# Altium footprint library IC_updated.PcbLib: 64 footprints (part 3 of 4)
Each footprint in its own frame and in the unit in brackets; x right, y up, seen from the top. Pads: shape width x height; smd on the part's side, far side on the other; paste and mask are expansions set on the pad; w line width, h text height; cw(c..) or ccw(c..) is an arc to the next point about the centre after c.
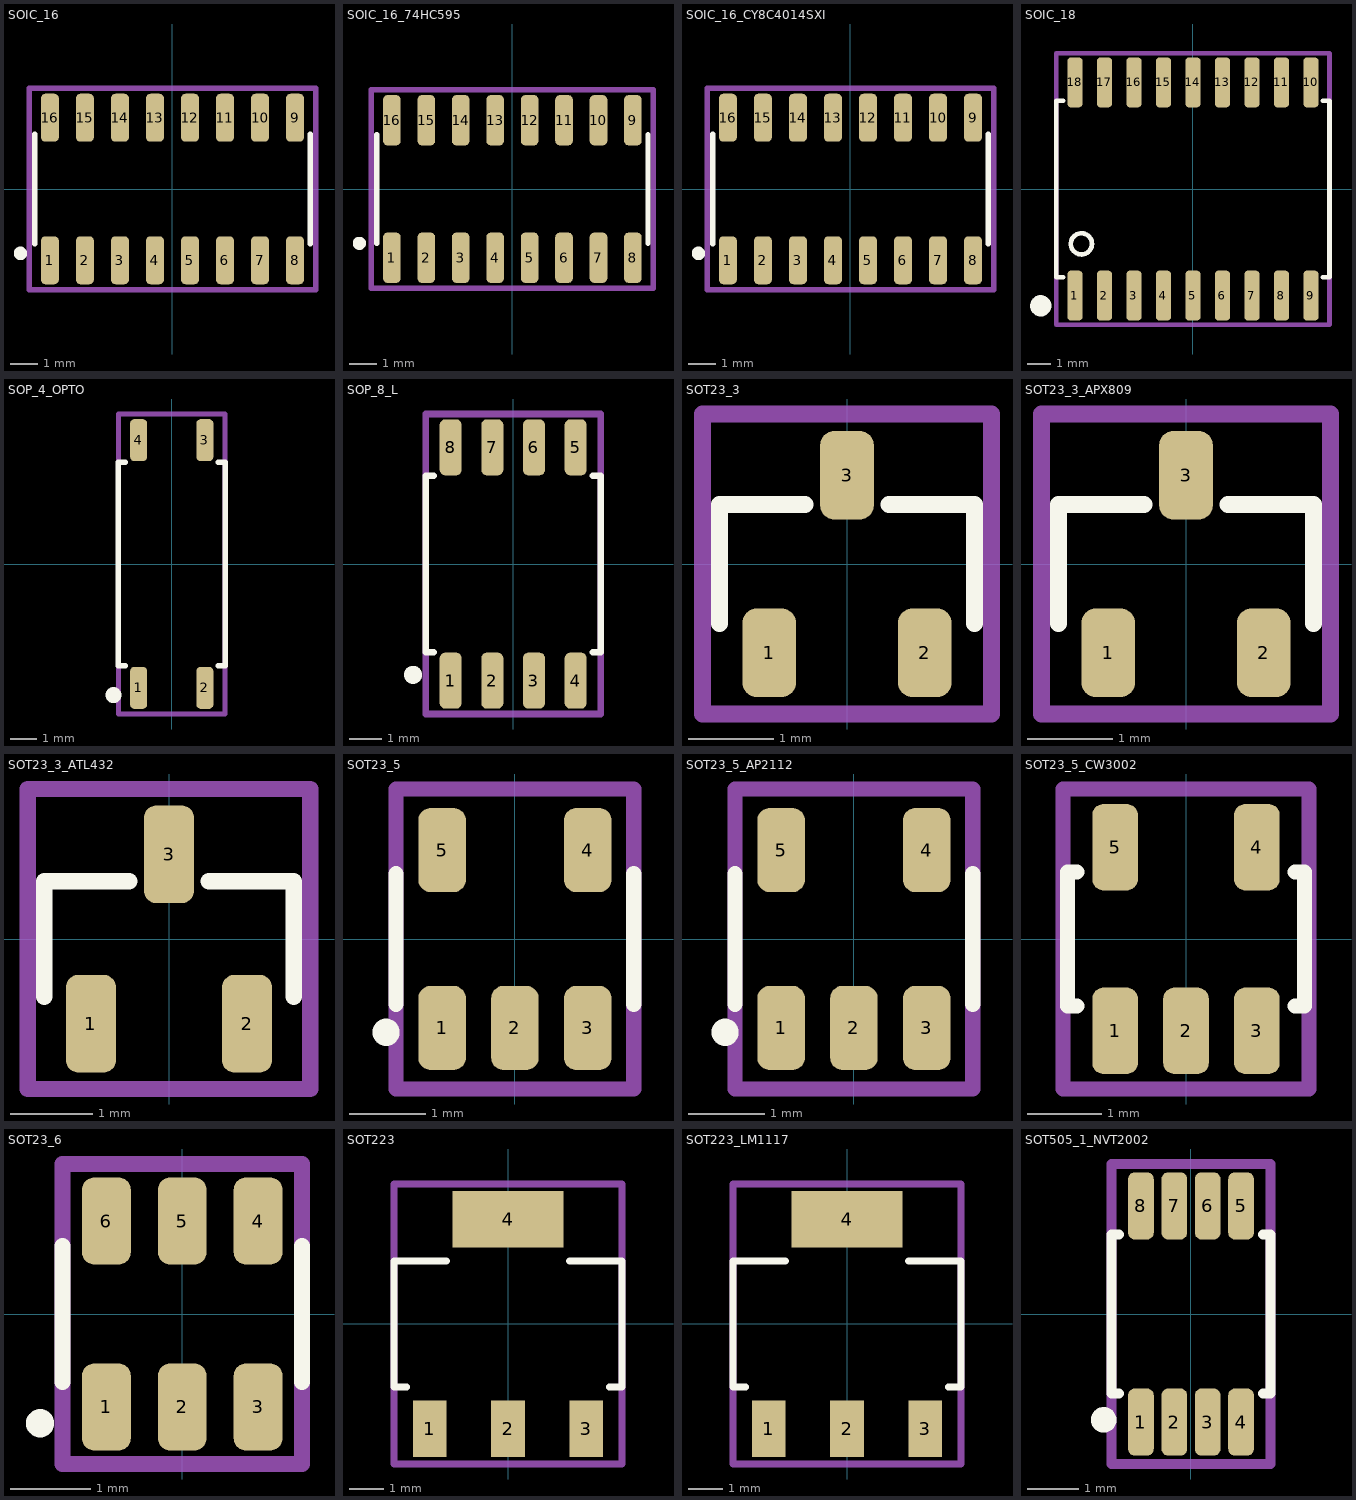
[diagram p2: the footprints below, top view; thin cyan lines are the x and y axes]

## SOIC_16 [mm]
pads (16):
  rrect49% 0.65x1.74 smd: 1(-4.445,-2.585) 2(-3.175,-2.585) 3(-1.905,-2.585) 4(-0.635,-2.585) 5(0.635,-2.585) 6(1.905,-2.585) 7(3.175,-2.585) 8(4.445,-2.585) 9(4.445,2.585) 10(3.175,2.585) 11(1.905,2.585) 12(0.635,2.585) 13(-0.635,2.585) 14(-1.905,2.585) 15(-3.175,2.585) 16(-4.445,2.585)
Top Overlay:
  circle w0.381: c-5.516,-2.334 r0.05
  lines w0.2: -4.99,-1.99 -4.99,1.99 ; 4.99,-1.99 4.99,1.99
Mechanical 13:
  lines w0.2: -5.2,-3.655 -5.2,-2.2 -5.2,2.2 -5.2,3.655 5.2,3.655 5.2,2.2 5.2,-2.2 5.2,-3.655 -5.2,-3.655
  text ".Designator" at -4.369,-0.178 h1.5
3D body "SOIC16P127_989X602X172L64X41.STEP": height 1.73, standoff 0, extent -4.947,-3.01 4.947,3.01

## SOIC_16_74HC595 [mm] "Small Outline IC (SOIC), 1.27 mm pitch; 16 pin, 9.90 mm L X 3.90 mm W X 1.75 mm H body"
height 1.75
pads (16):
  rrect49% 0.65x1.85 smd: 1(-4.445,-2.535) 2(-3.175,-2.535) 3(-1.905,-2.535) 4(-0.635,-2.535) 5(0.635,-2.535) 6(1.905,-2.535) 7(3.175,-2.535) 8(4.445,-2.535) 9(4.445,2.535) 10(3.175,2.535) 11(1.905,2.535) 12(0.635,2.535) 13(-0.635,2.535) 14(-1.905,2.535) 15(-3.175,2.535) 16(-4.445,2.535)
Top Overlay:
  circle w0.381: c-5.643,-2.004 r0.05
  lines w0.2: -5,-2 -5,2 ; 5,-2 5,2
Mechanical 13:
  lines w0.2: -5.2,-3.66 -5.2,-2.2 -5.2,2.2 -5.2,3.66 5.2,3.66 5.2,2.2 5.2,-2.2 5.2,-3.66 -5.2,-3.66
  text ".Designator" at -4.724,-0.229 h1.5
3D body "SOIC16P127_990X600X175L70X42.STEP": height 1.75, standoff 0, extent -4.95,-3 4.95,3

## SOIC_16_CY8C4014SXI [mm]
pads (16):
  rrect49% 0.65x1.74 smd: 1(-4.445,-2.585) 2(-3.175,-2.585) 3(-1.905,-2.585) 4(-0.635,-2.585) 5(0.635,-2.585) 6(1.905,-2.585) 7(3.175,-2.585) 8(4.445,-2.585) 9(4.445,2.585) 10(3.175,2.585) 11(1.905,2.585) 12(0.635,2.585) 13(-0.635,2.585) 14(-1.905,2.585) 15(-3.175,2.585) 16(-4.445,2.585)
Top Overlay:
  circle w0.381: c-5.516,-2.334 r0.05
  lines w0.2: -4.99,-1.99 -4.99,1.99 ; 4.99,-1.99 4.99,1.99
Mechanical 13:
  lines w0.2: -5.2,-3.655 -5.2,-2.2 -5.2,2.2 -5.2,3.655 5.2,3.655 5.2,2.2 5.2,-2.2 5.2,-3.655 -5.2,-3.655
  text ".Designator" at -4.369,-0.178 h1.5
3D body "SOIC16P127_989X602X172L64X41.STEP": height 1.73, standoff 0, extent -4.947,-3.01 4.947,3.01

## SOIC_18 [mm] "Small Outline IC (SOIC), 1.27 mm pitch; 18 pin, 11.55 mm L X 7.50 mm W X 2.65 mm H body"
height 2.65
pads (18):
  rrect52% 0.66x2.16 smd: 1(-5.08,-4.59) 2(-3.81,-4.59) 3(-2.54,-4.59) 4(-1.27,-4.59) 5(0,-4.59) 6(1.27,-4.59) 7(2.54,-4.59) 8(3.81,-4.59) 9(5.08,-4.59) 10(5.08,4.59) 11(3.81,4.59) 12(2.54,4.59) 13(1.27,4.59) 14(0,4.59) 15(-1.27,4.59) 16(-2.54,4.59) 17(-3.81,4.59) 18(-5.08,4.59)
Top Overlay:
  circle w0.508: c-6.553,-5.029 r0.203
  circle w0.2: c-4.801,-2.362 r0.458
  lines w0.2: -5.59,-3.8 -5.88,-3.8 -5.88,3.8 -5.59,3.8 ; 5.59,-3.8 5.88,-3.8 5.88,3.8 5.59,3.8
Mechanical 13:
  lines w0.2: -5.88,-5.842 -5.88,5.842 5.88,5.842 5.88,-5.842 -5.88,-5.842
  text ".Designator" at -4.445,-0.152 h1.5
3D body "SOIC18P127_1155X1030X265L83X41.STEP": height 2.65, standoff 0, extent -5.775,-5.15 5.775,5.15

## SOP_4_OPTO [mm] "Small Outline IC (SOIC), 2.54 mm pitch; 4 pin, 3.80 mm L X 7.50 mm W X 2.20 mm H body"
height 2.2
pads (4):
  rrect49% 0.65x1.61 smd: 1(-1.27,-4.75) 2(1.27,-4.75) 3(1.27,4.75) 4(-1.27,4.75)
Top Overlay:
  circle w0.508: c-2.235,-5.029 r0.05
  lines w0.2: -1.775,-3.9 -2.05,-3.9 -2.05,3.9 -1.775,3.9 ; 1.775,-3.9 2.05,-3.9 2.05,3.9 1.775,3.9
Mechanical 13:
  lines w0.2: -2.047,-5.755 -2.047,-4.125 -2.047,4.075 -2.047,5.755 2.047,5.755 2.047,4.075 2.047,-4.125 2.047,-5.755 -2.047,-5.755
  text ".Designator" at 0.305,-3.505 h1.5
3D body "SOIC4P254_380X1010X220L50X40.STEP": height 2.2, standoff 0, extent -1.9,-5.05 1.9,5.05

## SOP_8_L [mm] "Small Outline IC (SOIC), 1.27 mm pitch; 8 pin, 5.23 mm L X 5.28 mm W X 2.16 mm H body"
height 2.16
pads (8):
  rrect51% 0.67x1.71 smd: 1(-1.905,-3.555) 2(-0.635,-3.555) 3(0.635,-3.555) 4(1.905,-3.555) 5(1.905,3.555) 6(0.635,3.555) 7(-0.635,3.555) 8(-1.905,3.555)
Top Overlay:
  circle w0.5: c-3.048,-3.378 r0.025
  lines w0.2: -2.42,-2.69 -2.67,-2.69 -2.67,2.69 -2.42,2.69 ; 2.42,-2.69 2.67,-2.69 2.67,2.69 2.42,2.69
Mechanical 13:
  lines w0.2: -2.67,-4.572 -2.67,4.572 2.67,4.572 2.67,-4.572 -2.67,-4.572
  text ".Designator" at -2.438,-0.356 h1.5
3D body "SOIC8P127_523X790X216L65X43.STEP": height 2.16, standoff 0, extent -2.615,-3.95 2.615,3.95

## SOT23_3 [mm]
pads (3):
  rrect51% 0.63x1.04 smd: 1(-0.915,-1.045) 2(0.915,-1.045) 3(0,1.045)
Top Overlay:
  lines w0.2: -1.5,-0.7 -1.5,0.7 -0.495,0.7 ; 0.495,0.7 1.5,0.7 1.5,-0.7
Mechanical 13:
  lines w0.2: -1.7,-1.765 1.7,-1.765 1.7,-0.9 1.7,0.9 1.7,1.765 -1.7,1.765 -1.7,0.9 -1.7,-0.9 -1.7,-1.765
  text ".Designator" at -1.549,-0.178 h1
3D body "SOT23-3P91_240X110L40X44.STEP": height 1.1, standoff 0, extent -1.45,-1.2 1.45,1.2

## SOT23_3_APX809 [mm] "Small Outline Transistor (SOT23), 0.915 mm pitch; 3 pin, 2.90 mm L X 1.30 mm W X 1.10 mm H body"
height 1.1
pads (3):
  rrect51% 0.63x1.04 smd: 1(-0.915,-1.045) 2(0.915,-1.045) 3(0,1.045)
Top Overlay:
  lines w0.2: -1.5,-0.7 -1.5,0.7 -0.495,0.7 ; 0.495,0.7 1.5,0.7 1.5,-0.7
Mechanical 13:
  lines w0.2: -1.7,-1.765 -1.7,-0.9 -1.7,0.9 -1.7,1.765 1.7,1.765 1.7,0.9 1.7,-0.9 1.7,-1.765 -1.7,-1.765
  text ".Designator" at -1.549,-0.178 h1
3D body "SOT23-3P91_240X110L40X44.STEP": height 1.1, standoff 0, extent -1.45,-1.2 1.45,1.2

## SOT23_3_ATL432 [mm] "Small Outline Transistor (SOT23), 0.95 mm pitch; 3 pin, 2.92 mm L X 1.30 mm W X 1.12 mm H body"
height 1.12
pads (3):
  rrect49% 0.61x1.19 smd: 1(-0.95,-1.03) 2(0.95,-1.03) 3(0,1.03)
Top Overlay:
  lines w0.2: -1.52,-0.7 -1.52,0.7 -0.485,0.7 ; 0.485,0.7 1.52,0.7 1.52,-0.7
Mechanical 13:
  lines w0.2: -1.72,-1.825 -1.72,-0.9 -1.72,0.9 -1.72,1.825 1.72,1.825 1.72,0.9 1.72,-0.9 1.72,-1.825 -1.72,-1.825
  text ".Designator" at -1.549,-0.229 h1
3D body "SOT23-3P95_237X112L40X40.STEP": height 1.12, standoff 0, extent -1.46,-1.185 1.46,1.185

## SOT23_5 [mm] "Small Outline Transistor (SOT23), 0.95 mm pitch; 5 pin, 2.90 mm L X 1.55 mm W X 1.45 mm H body"
height 1.45
pads (5):
  rrect52% 0.62x1.1 smd: 1(-0.95,-1.16) 2(0,-1.16) 3(0.95,-1.16) 4(0.95,1.16) 5(-0.95,1.16)
Top Overlay:
  circle w0.254: c-1.681,-1.216 r0.05
  lines w0.2: -1.55,-0.85 -1.55,0.85 ; 1.55,-0.85 1.55,0.85
Mechanical 13:
  lines w0.2: -1.55,-1.956 1.55,-1.956 1.55,1.956 -1.55,1.956 -1.55,-1.956
  text ".Designator" at -1.321,-0.178 h1
3D body "SOT23-5P95_285X130L45X42.STEP": height 1.3, standoff 0, extent -1.5,-1.425 1.5,1.425

## SOT23_5_AP2112 [mm]
pads (5):
  rrect52% 0.62x1.1 smd: 1(-0.95,-1.16) 2(0,-1.16) 3(0.95,-1.16) 4(0.95,1.16) 5(-0.95,1.16)
Top Overlay:
  circle w0.254: c-1.681,-1.216 r0.05
  lines w0.2: -1.55,-0.85 -1.55,0.85 ; 1.55,-0.85 1.55,0.85
Mechanical 13:
  lines w0.2: -1.55,-1.956 -1.55,1.956 1.55,1.956 1.55,-1.956 -1.55,-1.956
  text ".Designator" at -1.321,-0.178 h1
3D body "SOT23-5P95_285X130L45X42.STEP": height 1.3, standoff 0, extent -1.5,-1.425 1.5,1.425

## SOT23_5_CW3002 [mm] "Small Outline Transistor (SOT23), 0.95 mm pitch; 5 pin, 2.92 mm L X 1.60 mm W X 1.35 mm H body"
height 1.35
pads (5):
  rrect49% 0.61x1.16 smd: 1(-0.95,-1.23) 2(0,-1.23) 3(0.95,-1.23) 4(0.95,1.23) 5(-0.95,1.23)
Top Overlay:
  lines w0.2: -1.46,-0.9 -1.585,-0.9 -1.585,0.9 -1.46,0.9 ; 1.46,-0.9 1.585,-0.9 1.585,0.9 1.46,0.9
Mechanical 13:
  lines w0.2: -1.651,-2.01 1.651,-2.01 1.651,-1.1 1.651,1.1 1.651,2.01 -1.651,2.01 -1.651,1.1 -1.651,-1.1 -1.651,-2.01
  text ".Designator" at -1.422,-0.203 h1
3D body "SOT23-5P95_280X135L45X43.STEP": height 1.35, standoff 0, extent -1.46,-1.4 1.46,1.4

## SOT23_6 [mm] "Small Outline Transistor (SOT23), 0.95 mm pitch; 6 pin, 2.90 mm L X 1.60 mm W X 1.00 mm H body"
height 1
pads (6):
  rrect49% 0.61x1.09 smd: 1(-0.95,-1.165) 2(0,-1.165) 3(0.95,-1.165) 4(0.95,1.165) 5(0,1.165) 6(-0.95,1.165)
Top Overlay:
  circle w0.254: c-1.783,-1.369 r0.05
  lines w0.2: -1.5,-0.85 -1.5,0.85 ; 1.5,-0.85 1.5,0.85
Mechanical 13:
  lines w0.2: -1.5,-1.88 -1.5,1.88 1.5,1.88 1.5,-1.88 -1.5,-1.88
  text ".Designator" at -1.346,-0.254 h1
3D body "SOT23-6P95_280X100L40X40.STEP": height 1, standoff 0, extent -1.45,-1.4 1.45,1.4

## SOT223 [mm] "Small Outline Transistor (SOT223), 2.30 mm pitch; 4 pin, 6.50 mm L X 3.50 mm W X 1.80 mm H body"
height 1.8
pads (4):
  rect 0.99x1.66 smd: 1(-2.3,-3.075) 2(0,-3.075) 3(2.3,-3.075)
  rect 3.25x1.66 smd: 4(0,3.075)
Top Overlay:
  lines w0.2: -2.975,-1.85 -3.35,-1.85 -3.35,1.85 -1.805,1.85 ; 1.805,1.85 3.35,1.85 3.35,-1.85 2.975,-1.85
Mechanical 13:
  lines w0.2: -3.35,-4.115 3.35,-4.115 3.35,4.115 -3.35,4.115 -3.35,-4.115
  text ".Designator" at -3.099,-0.406 h1.5
3D body "SOT223-4P230_700X180L75X75.STEP": height 1.8, standoff 0, extent -3.25,-3.5 3.25,3.5

## SOT223_LM1117 [mm] "Small Outline Transistor (SOT223), 2.30 mm pitch; 4 pin, 6.50 mm L X 3.50 mm W X 1.80 mm H body"
height 1.8
pads (4):
  rect 0.99x1.66 smd: 1(-2.3,-3.075) 2(0,-3.075) 3(2.3,-3.075)
  rect 3.25x1.66 smd: 4(0,3.075)
Top Overlay:
  lines w0.2: -2.975,-1.85 -3.35,-1.85 -3.35,1.85 -1.805,1.85 ; 1.805,1.85 3.35,1.85 3.35,-1.85 2.975,-1.85
Mechanical 13:
  lines w0.2: -3.35,-4.115 3.35,-4.115 3.35,4.115 -3.35,4.115 -3.35,-4.115
  text ".Designator" at -3.099,-0.406 h1.5
3D body "SOT223-4P230_700X180L75X75.STEP": height 1.8, standoff 0, extent -3.25,-3.5 3.25,3.5

## SOT505_1_NVT2002 [mm] "Small Outline Pkg (SOP), 0.65 mm pitch; 8 pin, 3.00 mm L X 3.00 mm W X 1.10 mm H body"
height 1.1
pads (8):
  rrect52% 0.5x1.31 smd: 1(-0.975,-2.105) 2(-0.325,-2.105) 3(0.325,-2.105) 4(0.975,-2.105) 5(0.975,2.105) 6(0.325,2.105) 7(-0.325,2.105) 8(-0.975,2.105)
Top Overlay:
  circle w0.25: c-1.7,-2.061 r0.125
  lines w0.2: -1.405,-1.55 -1.55,-1.55 -1.55,1.55 -1.405,1.55 ; 1.405,-1.55 1.55,-1.55 1.55,1.55 1.405,1.55
Mechanical 13:
  lines w0.2: -1.55,-2.921 1.55,-2.921 1.55,2.921 -1.55,2.921 -1.55,-2.921
  text ".Designator" at -1.397,-0.457 h1.5
3D body "SOP8P65_300X490X110L55X35.STEP": height 1.1, standoff 0, extent -1.5,-2.45 1.5,2.45